# Altium footprint library SOT SOD TO DAPK.PcbLib: 156 footprints (part 5 of 10)
Each footprint in its own frame and in the unit in brackets; x right, y up, seen from the top. Pads: shape width x height; smd on the part's side, far side on the other; paste and mask are expansions set on the pad; w line width, h text height; cw(c..) or ccw(c..) is an arc to the next point about the centre after c.
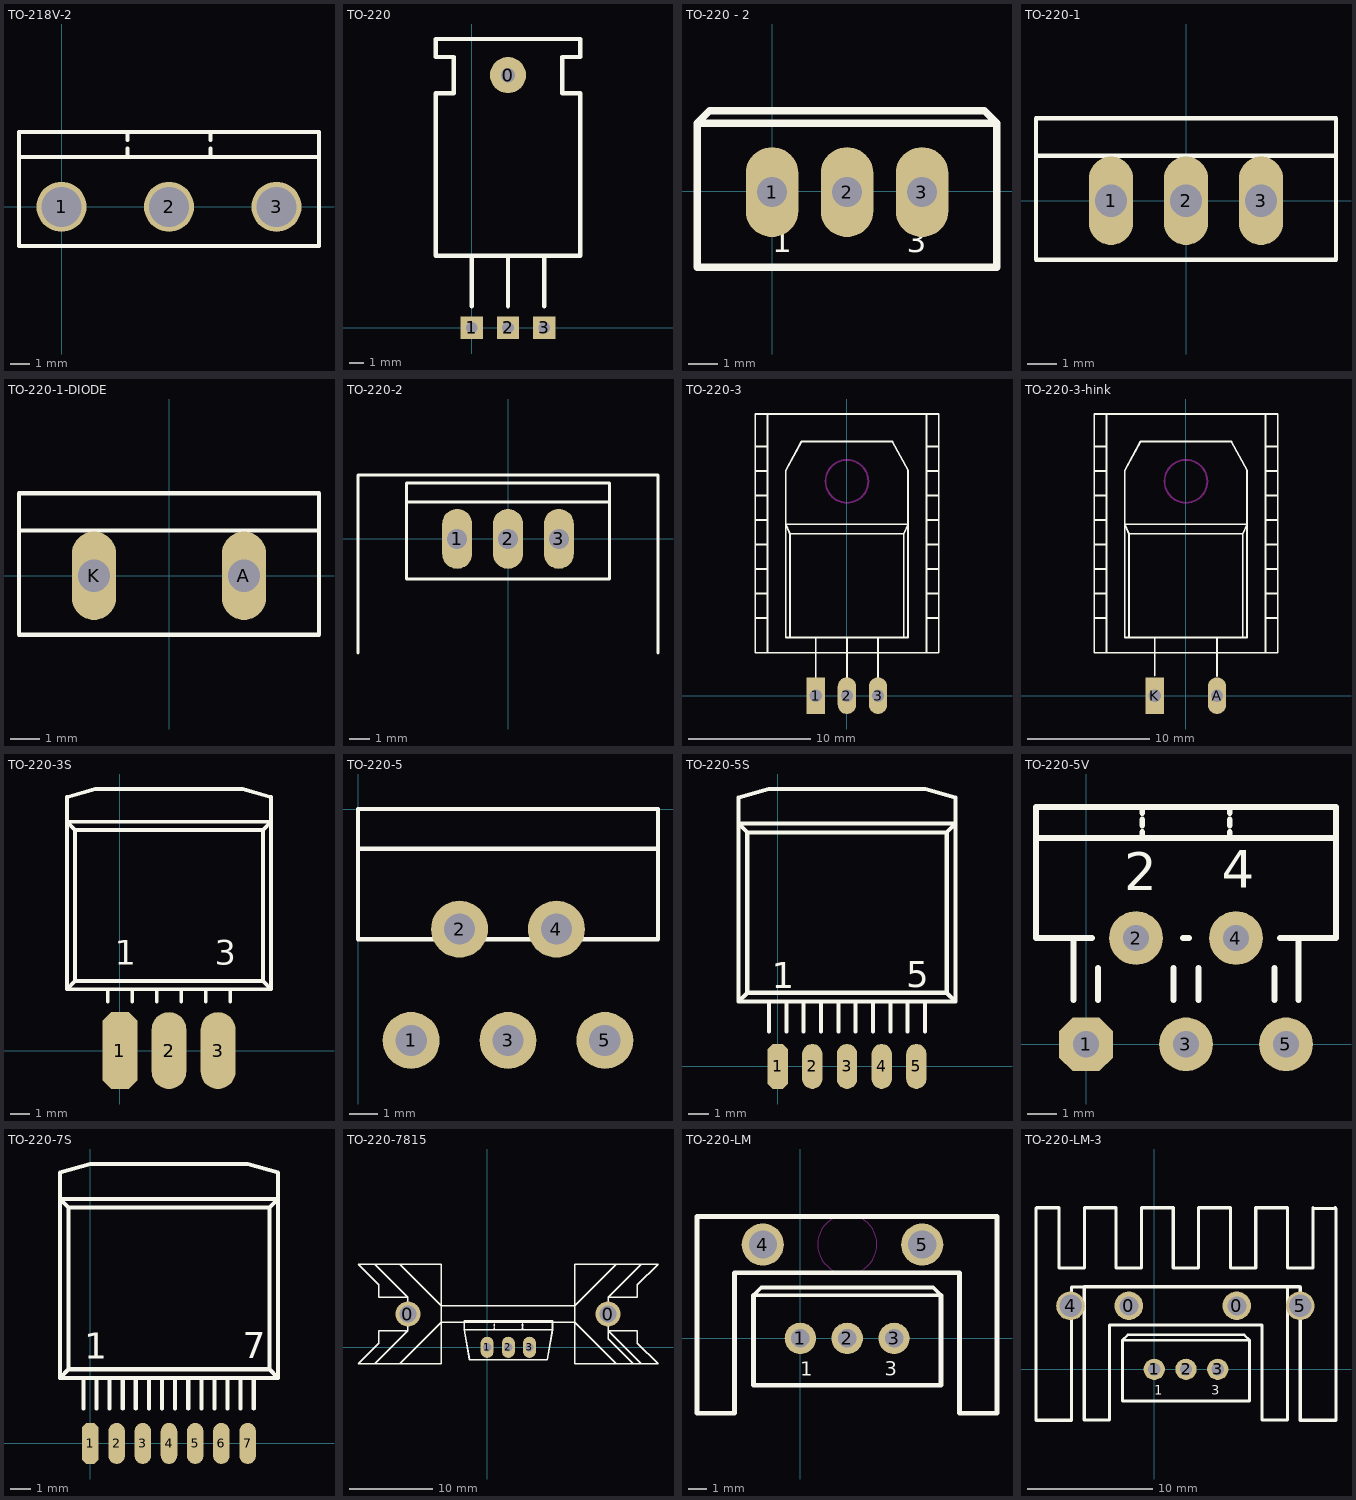
[diagram p4: the footprints below, top view; thin cyan lines are the x and y axes]

## TO-218V-2 [mil]
pads (3):
  round 100 hole 80: 1(0,0) 2(215,0) 3(430,0)
Top Overlay:
  lines w7.87: -85,100 515,100 ; 131.67,100 131.67,116.67 ; 131.67,133.33 131.67,150 ; 298.33,100 298.33,116.67 ; 298.33,133.33 298.33,150 ; -85,-78.74 -85,150 515,150 515,-78.74 -85,-78.74
3D body "User Library-TO218.STEP": height 993.23, standoff 0, extent -80.28,-88.98 510.28,100

## TO-220 [mil]
pads (4):
  round 100 hole 40: 0(100,700)
  rect 62x62 hole 32: 1(0,0) 2(100,0) 3(200,0)
Top Overlay:
  lines w12: 0,60 0,200 ; 100,60 100,200 ; 200,60 200,200 ; -100,200 -100,650 -50,650 -50,750 -100,750 -100,800 300,800 300,750 250,750 250,650 300,650 300,200 -100,200
3D body "User Library-TO220 L.STEP": height 177.17, standoff -118.11, extent -98.7,-2.88 295,772.88

## TO-220 - 2 [mil]
pads (3):
  oval 70x120 hole 40: 1(0,-1) 2(100,-1) 3(200,-1)
Top Overlay:
  lines w10: -100,90.67 -100,-100.56 -99.56,-101 299.56,-101 300,-100.56 300,90.67 ; -100,90.67 300,90.67 ; -100,90.67 -83.33,107.33 283.33,107.33 300,90.67
  text "3" at 180,-81 h30
  text "1" at 0,-81 h30
3D body "User Library-TO-220-1.STEP": height 740.16, standoff -392.91, extent -93.88,-84 295.88,93.17

## TO-220-1 [mm]
pads (3):
  oval 1.5x3 hole 1.1: 1(-2.54,0) 2(0,0) 3(2.54,0)
Top Overlay:
  lines w0.15: -5.08,1.524 5.08,1.521 ; -5.08,-2 5.08,-2 5.08,2.79 -5.08,2.79 -5.08,-2
3D body "User Library-POWER MOSFET, NON-SURFACE-MOUNT.step": height 18.3, standoff -10.08, extent -4.834,-1.996 4.818,2.504
3D body "IC1.STEP": height 19.5, standoff -4, extent -5.25,-1.955 5.25,2.745

## TO-220-1-DIODE [mm]
pads (2):
  oval 1.5x3 hole 1.1: A(2.54,0) K(-2.54,0)
Top Overlay:
  lines w0.15: -5.08,1.53 5.08,1.53 ; -5.08,-2 5.08,-2 5.08,2.79 -5.08,2.79 -5.08,-2
3D body "IC2.STEP": height 19.5, standoff -4, extent -5.25,-1.955 5.25,2.745

## TO-220-2 [mm]
pads (3):
  oval 1.5x3 hole 1: 1(-2.54,0) 2(0,0) 3(2.54,0)
Top Overlay:
  lines w0.15: -7.5,-5.713 -7.5,3.2 7.5,3.2 7.5,-5.713 ; -5.08,1.848 5.08,1.848 ; -5.08,-2 -5.08,2.79 5.08,2.79 5.08,-2 -5.08,-2
3D body "User Library-Package T0-220AB With Heatsing Vertical Mount-1.STEP": height 20.07, standoff -5.86, extent -8.5,-5.787 8.5,4.433

## TO-220-3 [mm]
pads (3):
  rect 1.5x3 hole 1: 1(-2.54,0)
  oval 1.5x3 hole 1: 2(0,0) 3(2.54,0)
Top Overlay:
  lines w0.15: -7.493,6.343 -6.493,6.343 ; -7.493,8.343 -6.493,8.343 ; -7.493,10.343 -6.493,10.343 ; -7.493,12.343 -6.493,12.343 ; -7.493,14.343 -6.493,14.343 ; -7.493,16.343 -6.493,16.343 ; -7.493,18.343 -6.493,18.343 ; -7.493,20.343 -6.493,20.343 ; -6.493,3.505 -6.493,23.005 ; -5,14 5,14 ; -5,14.005 -4.644,13.217 ; -5,18.377 -5,4.75 5,4.75 5,18.377 ; -5,18.388 -3.712,20.75 3.712,20.75 5,18.388 ; -4.644,4.75 -4.644,13.217 ; -2.54,0 -2.54,4.75 ; 0,0 0,4.75 ; 2.54,0 2.54,4.75 ; 4.644,4.75 4.644,13.217 ; 5,14.005 4.644,13.217 ; 6.507,3.505 6.507,23.005 ; 6.507,6.343 7.507,6.343 ; 6.507,8.343 7.507,8.343 ; 6.507,10.343 7.507,10.343 ; 6.507,12.343 7.507,12.343 ; 6.507,14.343 7.507,14.343 ; 6.507,16.343 7.507,16.343 ; 6.507,18.343 7.507,18.343 ; 6.507,20.343 7.507,20.343 ; -4.644,13.217 4.644,13.217 ; -7.493,3.505 -7.493,23.005 7.507,23.005 7.507,3.505 -7.493,3.505
Keep-Out Layer:
  circle w0.15: c0,17.5 r1.75
  circle w0.15: c0.007,17.505 r1.75
3D body "User Library-TO-220-2.step": height 10.39, standoff -2.31, extent -5.85,-0.325 5.864,21.773

## TO-220-3-hink [mm]
pads (2):
  oval 1.5x3 hole 1: A(2.54,0)
  rect 1.5x3 hole 1: K(-2.54,0)
Top Overlay:
  lines w0.15: -7.493,6.343 -6.493,6.343 ; -7.493,8.343 -6.493,8.343 ; -7.493,10.343 -6.493,10.343 ; -7.493,12.343 -6.493,12.343 ; -7.493,14.343 -6.493,14.343 ; -7.493,16.343 -6.493,16.343 ; -7.493,18.343 -6.493,18.343 ; -7.493,20.343 -6.493,20.343 ; -6.493,3.505 -6.493,23.005 ; -5,14 5,14 ; -5,14.005 -4.644,13.217 ; -5,18.377 -5,4.75 5,4.75 5,18.377 ; -5,18.388 -3.712,20.75 3.712,20.75 5,18.388 ; -4.644,4.75 -4.644,13.217 ; -2.54,1.654 -2.54,4.75 ; 2.54,1.611 2.54,4.75 ; 4.644,4.75 4.644,13.217 ; 5,14.005 4.644,13.217 ; 6.507,3.505 6.507,23.005 ; 6.507,6.343 7.507,6.343 ; 6.507,8.343 7.507,8.343 ; 6.507,10.343 7.507,10.343 ; 6.507,12.343 7.507,12.343 ; 6.507,14.343 7.507,14.343 ; 6.507,16.343 7.507,16.343 ; 6.507,18.343 7.507,18.343 ; 6.507,20.343 7.507,20.343 ; -4.644,13.217 4.644,13.217 ; -7.493,3.505 7.507,3.505 7.507,23.005 -7.493,23.005 -7.493,3.505
Keep-Out Layer:
  circle w0.15: c0,17.5 r1.75
  circle w0.15: c0.007,17.505 r1.75
3D body "User Library-Disipador TO.step": height 10, standoff 0, extent -8.493,1.491 8.507,21.491

## TO-220-3S [mil]
pads (3):
  oct 70.83x156.67 smd: 1(0,0)
  oval 70.83x156.67 smd: 2(100,0) 3(200,0)
Top Overlay:
  lines w7.87: -25,100 -25,125 ; 25,100 25,125 ; 75,100 75,125 ; 125,100 125,125 ; 175,100 175,125 ; 225,100 225,125 ; -108.33,125 308.33,125 ; -108.33,125 -108.33,466.67 ; -108.33,125 -91.67,141.67 ; -108.33,466.67 308.33,466.67 ; -108.33,466.67 -108.33,516.67 -50,533.33 250,533.33 308.33,516.67 308.33,466.67 ; -108.33,466.67 -91.67,450 ; -91.67,141.67 -91.67,450 ; -91.67,141.67 291.67,141.67 ; -91.67,450 291.67,450 ; 291.67,141.67 291.67,450 ; 291.67,141.67 308.33,125 ; 291.67,450 308.33,466.67 ; 308.33,125 308.33,466.67
  text "3" at 193.03,175.05 h50
  text "1" at -10.26,175.05 h50

## TO-220-5 [mm]
pads (5):
  round 2 hole 1.1: 1(1.867,-8.128) 2(3.569,-4.216) 3(5.271,-8.128) 4(6.972,-4.216) 5(8.674,-8.128)
Top Overlay:
  lines w0.15: 0,-1.397 10.541,-1.397 ; 0,-4.572 0,0 10.541,0 10.541,-4.572 0,-4.572
3D body "SW3dPS-TO220-51.STEP": height 21.35, standoff -2.64, extent 0.191,-8.165 10.351,0.075

## TO-220-5S [mil]
pads (5):
  oct 39.17x86.67 smd: 1(0,0)
  oval 39.17x86.67 smd: 2(66.67,0) 3(133.33,0) 4(200,0) 5(266.67,0)
Top Overlay:
  lines w7.87: -16.67,66.93 -16.67,125 ; 16.67,66.93 16.67,125 ; 50,66.93 50,125 ; 83.33,66.93 83.33,125 ; 116.67,66.93 116.67,125 ; 150,66.93 150,125 ; 183.33,66.93 183.33,125 ; 216.67,66.93 216.67,125 ; 250,66.93 250,125 ; 283.33,66.93 283.33,125 ; -75,125 341.67,125 ; -75,125 -75,466.67 ; -75,125 -58.33,141.67 ; -75,466.67 341.67,466.67 ; -75,466.67 -75,516.67 -16.67,533.33 283.33,533.33 341.67,516.67 341.67,466.67 ; -75,466.67 -58.33,450 ; -58.33,141.67 -58.33,450 ; -58.33,141.67 325,141.67 ; -58.33,450 325,450 ; 325,141.67 325,450 ; 325,141.67 341.67,125 ; 325,450 341.67,466.67 ; 341.67,125 341.67,466.67
  text "1" at -11.1,150.8 h50
  text "5" at 247.1,151.89 h50

## TO-220-5V [mil]
pads (5):
  oct 71.67x71.67 hole 35: 1(0,0)
  round 71.67 hole 35: 2(66.67,141.67) 3(133.33,0) 4(200,141.67) 5(266.67,0)
Top Overlay:
  lines w7.87: -66.67,275 333.33,275 ; -16.67,59.05 -16.67,141.67 ; 7.87,141.67 -66.67,141.67 -66.67,316.67 333.33,316.67 333.33,141.67 258.79,141.67 ; 15.75,59.05 15.75,101.5 ; 75,275 75,283.33 ; 75,291.67 75,300 ; 75,308.33 75,316.67 ; 116.67,59.05 116.67,101.5 ; 129.4,141.67 137.27,141.67 ; 150,59.05 150,101.5 ; 191.67,275 191.67,283.33 ; 191.67,291.67 191.67,300 ; 191.67,308.33 191.67,316.67 ; 251.21,59.05 251.21,101.5 ; 283.33,59.05 283.33,141.67
  text "4" at 180.98,208.71 h50
  text "2" at 51.22,205.36 h50
3D body "SW3dPS-TO220-51.STEP": height 840.55, standoff -103.94, extent -62.5,-6.46 337.5,317.95

## TO-220-7S [mil]
pads (7):
  oct 31.67x78.33 smd: 1(0,0)
  oval 31.67x78.33 smd: 2(50,0) 3(100,0) 4(150,0) 5(200,0) 6(250,0) 7(300,0)
Top Overlay:
  lines w7.87: -13.33,66.93 -13.33,125 ; 11.67,66.93 11.67,125 ; 36.67,66.93 36.67,125 ; 61.67,66.93 61.67,125 ; 86.67,66.93 86.67,125 ; 111.67,66.93 111.67,125 ; 136.67,66.93 136.67,125 ; 161.67,66.93 161.67,125 ; 186.67,66.93 186.67,125 ; 211.67,66.93 211.67,125 ; 236.67,66.93 236.67,125 ; 261.67,66.93 261.67,125 ; 286.67,66.93 286.67,125 ; 311.67,66.93 311.67,125 ; -58.33,125 -41.67,141.67 ; -58.33,125 -58.33,466.67 ; -58.33,125 358.33,125 ; -58.33,466.67 -41.67,450 ; -58.33,466.67 -58.33,516.67 0,533.33 300,533.33 358.33,516.67 358.33,466.67 ; -58.33,466.67 358.33,466.67 ; -41.67,141.67 341.67,141.67 ; -41.67,141.67 -41.67,450 ; -41.67,450 341.67,450 ; 341.67,141.67 358.33,125 ; 341.67,141.67 341.67,450 ; 341.67,450 358.33,466.67 ; 358.33,125 358.33,466.67
  text "7" at 290.27,162.98 h50
  text "1" at -11.5,161.9 h50

## TO-220-7815 [mm]
pads (5):
  round 3 hole 2: 0(-9.5,4) 0(14.5,4)
  oval 1.575x2.54 hole 1.016: 1(0,0) 2(2.54,0) 3(5.08,0)
Top Overlay:
  lines w0.15: -13.5,-2 -9.5,2 ; -13.5,10 -9.5,6 ; -10.5,-2 -5.5,3 ; -10.5,10 -5.5,5 ; 15.5,-2 10.5,3 ; 17.5,-2 14.5,1 14.5,2 ; 18.5,-2 14.5,2 ; 18.5,10 14.5,6 ; -9.5,2 -9.5,6 ; -9.5,2 -13,2 -13,0.5 -15.5,-2 -15,-2 -5.5,-2 -5.5,5 ; -9.5,6 -13,6 -13,7.5 -15.5,10 -15,10 -5.5,10 -5.5,5 ; -5.5,3 10.5,3 ; -5.5,3 -5.5,5 ; -5.5,5 10.5,5 ; 10.5,3 10.5,5 ; 10.5,5 15.5,10 ; 10.5,5 15.5,10 ; 14.5,2 14.5,6 ; 14.5,2 18,2 18,0.5 20.5,-2 10.5,-2 10.5,10 20.5,10 ; 14.5,6 18,6 18,7.5 20.5,10 ; 15.5,10 20.5,10
  lines w0.2: 0.847,2.117 0.847,2.328 ; 0.847,2.54 0.847,2.752 ; 0.847,2.963 0.847,3.175 ; 4.233,2.117 4.233,2.328 ; 4.233,2.54 4.233,2.752 ; 4.233,2.963 4.233,3.175 ; -2.752,2.117 7.832,2.117 ; -2.752,2.117 -2.117,-1.482 7.197,-1.482 7.832,2.117 ; -2.752,2.117 -2.752,3.175 7.832,3.175 7.832,2.117
3D body "User Library-TO220-AB PCB.STEP": height 22.05, standoff -1.5, extent -2.28,-1.778 7.62,2.679
3D body "User Library-Heat Sink 657-20ABP(Wakefield).STEP": height 50.8, standoff -3.96, extent -18.482,-9.017 23.368,16.383

## TO-220-LM [mm]
pads (5):
  round 1.7 hole 1: 1(0,0) 2(2.54,0) 3(5.08,0)
  round 2.286 hole 1.524: 4(-2.032,5.08) 5(6.604,5.08)
Top Overlay:
  lines w0.2: -2.54,2.328 7.62,2.328 7.197,2.752 -2.117,2.752 -2.54,2.328
  lines w0.254: -2.54,2.328 -2.54,-2.529 -2.529,-2.54 7.609,-2.54 7.62,-2.529 7.62,2.328 ; 10.657,3.556 10.657,6.604 ; 10.657,6.604 10.657,-4.064 8.625,-4.064 8.625,3.556 -3.567,3.556 -3.567,-4.064 -5.599,-4.064 -5.599,1.016 -5.599,3.556 -5.599,6.604 10.657,6.604
  text "3" at 4.572,-2.032 h0.76
  text "1" at 0,-2.032 h0.76
Keep-Out Layer:
  circle w0.025: c2.545,5.094 r1.606
3D body "User Library-Package T0-220AB With Heatsing Vertical Mount-1.STEP": height 21.07, standoff -4.86, extent -5.96,-5.775 11.04,4.445

## TO-220-LM-3 [mil]
pads (7):
  round 90 hole 60: 0(-80,200) 0(260,200)
  round 66.93 hole 39.37: 1(0,0) 2(100,0) 3(200,0)
  round 90 hole 70.87: 4(-263.72,199.65) 5(459.82,199.65)
Top Overlay:
  lines w7.87: -100,91.67 300,91.67 283.33,108.33 -83.33,108.33 -100,91.67
  lines w10: -372.44,379.39 -372.44,507.14 ; -372.44,391.91 -372.44,507.14 ; -100,91.67 -100,-99.56 -99.56,-100 299.56,-100 300,-99.56 300,91.67 ; 419.56,140 419.56,260 ; 459.82,119.65 459.82,199.65 ; 570.28,508.93 572.44,506.77 ; 572.44,387.75 572.44,506.77 ; -372.44,507.14 -370.65,508.93 -300.18,508.93 -300.18,319.39 -220.18,319.39 -220.18,508.93 -120.18,508.93 -120.18,319.39 -40.18,319.39 -40.18,508.93 59.82,508.93 59.82,319.39 139.82,319.39 139.82,508.93 239.82,508.93 239.82,319.39 319.82,319.39 319.82,508.93 399.82,508.93 419.82,508.93 419.82,319.39 499.82,319.39 499.82,508.93 501.97,506.77 572.44,506.77 ; -372.44,507.14 -372.44,-160.61 -260.18,-160.61 -260.18,259.65 -220.78,259.65 -220.44,260 ; -220.44,260 -220.44,140 -220.44,40 -220.44,-160 -140.44,-160 -140.44,140 339.56,140 339.56,-160 419.56,-160 419.56,260 ; -220.44,260 419.56,260 ; 419.56,260 459.47,260 459.82,259.65 459.82,-160.61 572.44,-160.61 572.44,506.77
  text "3" at 180,-80 h30
  text "1" at 0,-80 h30
3D body: height 1377.95, standoff 19.68, extent -265,110 490,280
3D body: height 1377.95, standoff 19.68, extent -375,-165 570,510
3D body "User Library-TO220-AB PCB.STEP": height 789.37, standoff -137.8, extent -94.88,-66.02 294.88,109.47